# Altium footprint library TelemetryFTP.PcbLib: 98 footprints (part 6 of 7)
Each footprint in its own frame and in the unit in brackets; x right, y up, seen from the top. Pads: shape width x height; smd on the part's side, far side on the other; paste and mask are expansions set on the pad; w line width, h text height; cw(c..) or ccw(c..) is an arc to the next point about the centre after c.
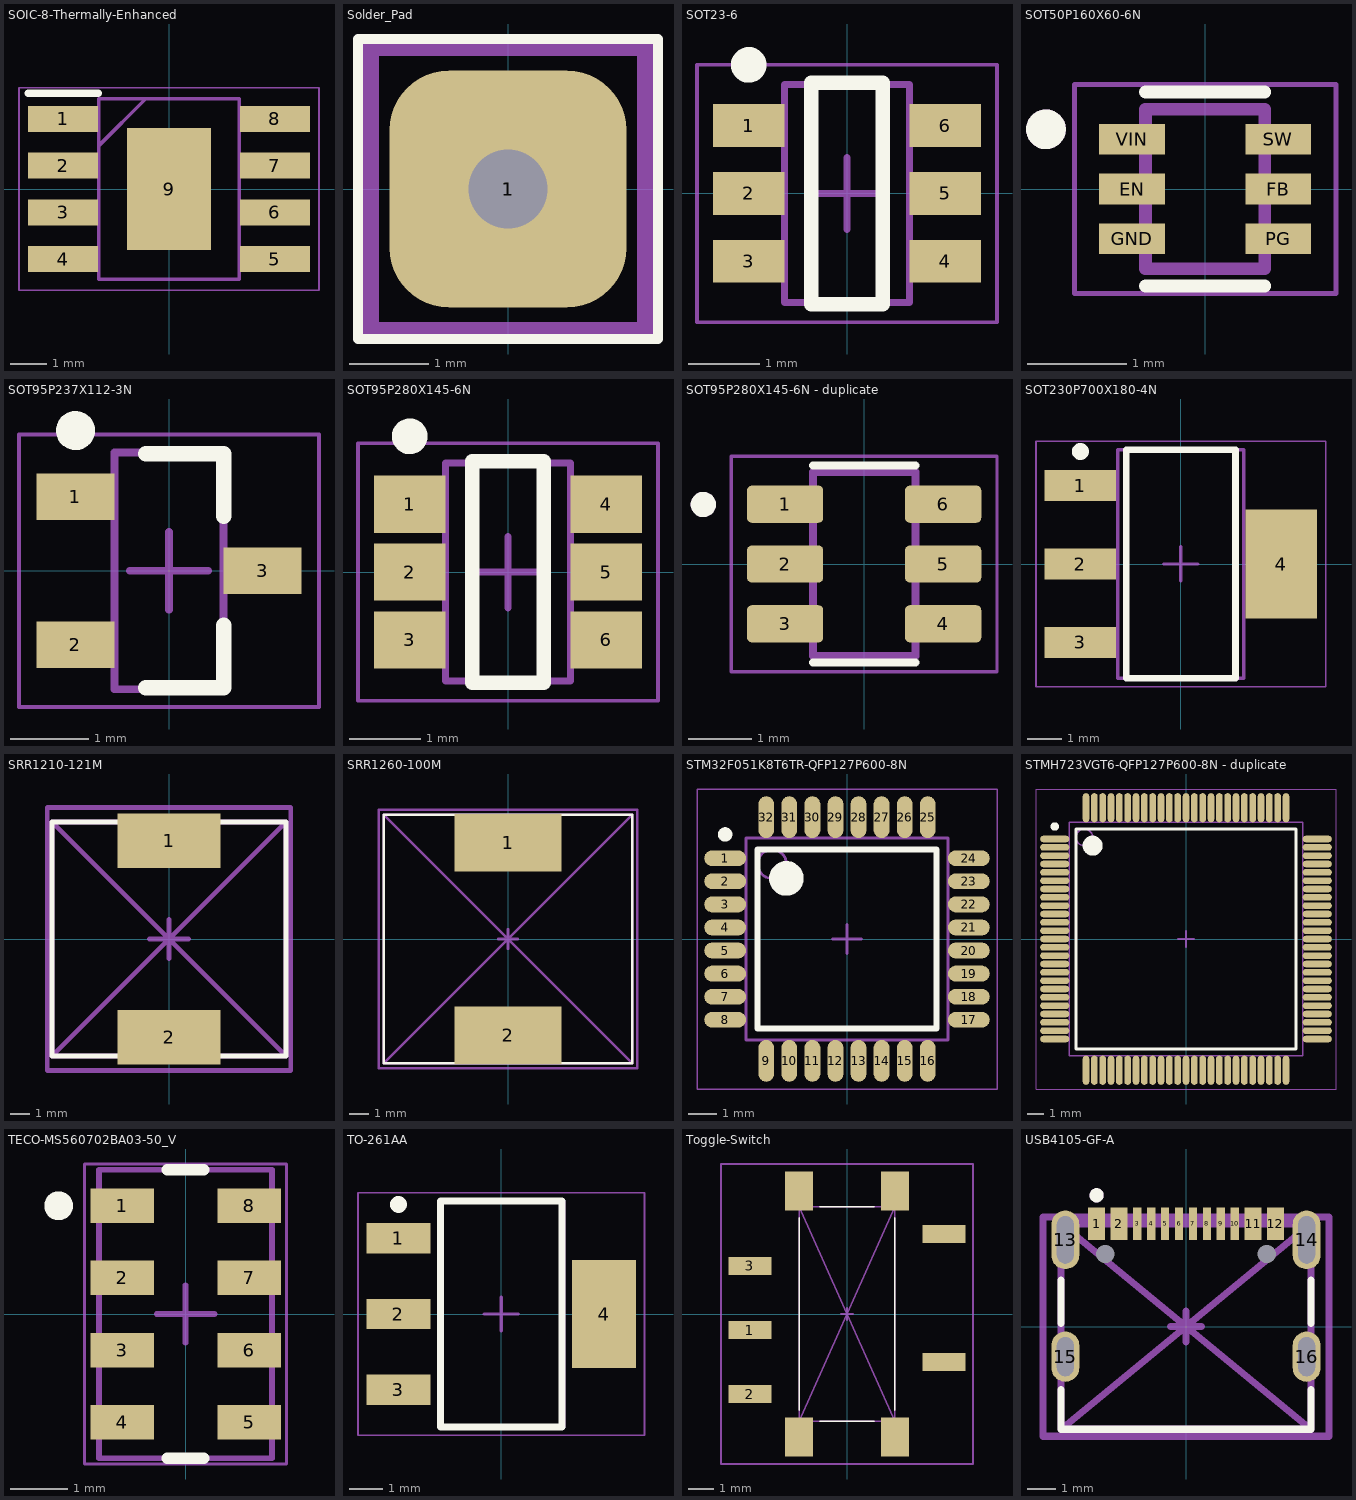
[diagram p5: the footprints below, top view; thin cyan lines are the x and y axes]

## SOIC-8-Thermally-Enhanced [mm] "Standard SOIC-8 symbol with thermal pad"
pads (9):
  rect 1.9x0.7 smd: 1(-2.875,1.905) 2(-2.875,0.635) 3(-2.875,-0.635) 4(-2.875,-1.905) 5(2.875,-1.905) 6(2.875,-0.635) 7(2.875,0.635) 8(2.875,1.905)
  rect 2.287x3.307 smd: 9(0,0)
Top Overlay:
  lines w0.2: -3.825,2.605 -1.925,2.605
Mechanical 13:
  lines w0.1: -1.905,1.181 -0.635,2.451 ; -1.905,-2.451 -1.905,2.451 1.905,2.451 1.905,-2.451 -1.905,-2.451
Mechanical 15:
  lines w0.05: -4.075,-2.752 -4.075,2.752 4.075,2.752 4.075,-2.752 -4.075,-2.752
3D body "NR111E.stp": height 1.5, standoff 0, extent -3.203,-2.451 3.203,2.451

## Solder_Pad [mm]
pads (2):
  round 1.1 hole 1 mask+0.05: 1(0,0)
  rrect50% 3x3 hole 0.5 mask+0.05: 1(0,0)
Top Overlay:
  lines w0.128: -1.9,-1.9 -1.9,1.9 1.9,1.9 1.9,-1.9 -1.9,-1.9
Top Courtyard:
  lines w0.128: -1.8,-1.8 -1.8,1.8 1.8,1.8 1.8,-1.8 -1.8,-1.8
Mechanical 13:
  lines w0.128: -1.7,-1.75 -1.7,1.75 1.7,1.75 1.7,-1.75 -1.7,-1.75
Top Component Center:
  lines w0.128: -0.5,0 0.475,0 ; 0,-0.5 0,0.5

## SOT23-6 [mm] "SOT23, 6-Leads, Body 2.90x2.80mm, Pitch 0.95mm, IPC Medium Density"
height 1.45
pads (6):
  rect 1x0.6 smd: 1(-1.375,0.95) 2(-1.375,0) 3(-1.375,-0.95) 4(1.375,-0.95) 5(1.375,0) 6(1.375,0.95)
Top Overlay:
  circle w0.25: c-1.375,1.8 r0.125
  lines w0.2: -0.5,-1.55 -0.5,1.55 0.5,1.55 0.5,-1.55 -0.5,-1.55
Top Courtyard:
  lines w0.05: -2.1,-1.8 2.1,-1.8 2.1,1.8 -2.1,1.8 -2.1,-1.8
  lines w0.1: -0.5,0 0.5,0 ; 0,-0.5 0,0.5
Top Assembly:
  lines w0.1: -0.875,-1.525 0.875,-1.525 0.875,1.525 -0.875,1.525 -0.875,-1.525
3D body: height 1.45, standoff 0, extent -0.875,-1.525 0.875,1.525

## SOT50P160X60-6N [mm]
pads (6):
  rect 0.66x0.31 smd mask+0.05: EN(-0.735,0) FB(0.735,0) GND(-0.735,-0.5) PG(0.735,-0.5) SW(0.735,0.5) VIN(-0.735,0.5)
Top Overlay:
  circle w0.2: c-1.6,0.6 r0.1
  lines w0.127: -0.6,-0.975 0.6,-0.975 ; -0.6,0.975 0.6,0.975
Mechanical 13:
  circle w0.2: c-1.6,0.6 r0.1
  lines w0.127: -0.6,-0.8 -0.6,0.8 0.6,0.8 0.6,-0.8 -0.6,-0.8
Mechanical 15:
  lines w0.05: -1.315,-1.05 -1.315,1.05 1.315,1.05 1.315,-1.05 -1.315,-1.05

## SOT95P237X112-3N [mm] "SOT23, 3-Leads, Body 2.92x2.37mm, Pitch 0.95mm, IPC Medium Density"
height 1.12
pads (3):
  rect 1x0.6 smd: 1(-1.2,0.95) 2(-1.2,-0.95) 3(1.2,0)
Top Overlay:
  circle w0.25: c-1.2,1.8 r0.125
  lines w0.2: -0.3,-1.5 0.7,-1.5 0.7,-0.7 ; -0.3,1.5 0.7,1.5 0.7,0.7
Top Courtyard:
  lines w0.05: -1.925,-1.75 -1.925,1.75 1.925,1.75 1.925,-1.75 -1.925,-1.75
  lines w0.1: -0.5,0 0.5,0 ; 0,-0.5 0,0.5
Top Assembly:
  lines w0.1: -0.7,-1.52 -0.7,1.52 0.7,1.52 0.7,-1.52 -0.7,-1.52
3D body: height 1.12, standoff 0.1, extent -0.7,-1.52 0.7,1.52

## SOT95P280X145-6N [mm] "SOT23, 6-Leads, Body 2.90x2.80mm, Pitch 0.95mm, IPC Medium Density"
height 1.45
pads (6):
  rect 1x0.8 smd mask+0.05: 1(-1.375,0.95) 2(-1.375,0) 3(-1.375,-0.95) 4(1.375,0.95) 5(1.375,0) 6(1.375,-0.95)
Top Overlay:
  circle w0.25: c-1.375,1.9 r0.125
  lines w0.2: -0.5,-1.55 0.5,-1.55 0.5,1.55 -0.5,1.55 -0.5,-1.55
Top Courtyard:
  lines w0.05: -2.1,-1.8 -2.1,1.8 2.1,1.8 2.1,-1.8 -2.1,-1.8
  lines w0.1: -0.5,0 0.5,0 ; 0,-0.5 0,0.5
Top Assembly:
  lines w0.1: -0.875,-1.525 -0.875,1.525 0.875,1.525 0.875,-1.525 -0.875,-1.525
3D body: height 1.45, standoff 0, extent -0.875,-1.525 0.875,1.525

## SOT95P280X145-6N - duplicate [mm]
pads (6):
  rrect25% 1.21x0.59 smd: 1(-1.255,0.95) 2(-1.255,0) 3(-1.255,-0.95) 4(1.255,-0.95) 5(1.255,0) 6(1.255,0.95)
Top Overlay:
  circle w0.2: c-2.555,0.945 r0.1
  lines w0.127: -0.813,-1.565 0.813,-1.565 ; -0.813,1.565 0.813,1.565
Mechanical 13:
  circle w0.2: c-2.555,0.945 r0.1
  lines w0.127: -0.813,-1.462 -0.813,1.462 0.813,1.462 0.813,-1.462 -0.813,-1.462
Mechanical 15:
  lines w0.05: -2.11,-1.713 2.11,-1.713 2.11,1.713 -2.11,1.713 -2.11,-1.713
3D body "step_temp.STEP": height 0.4, standoff -1.05, extent -1.4,-1.462 1.4,1.462

## SOT230P700X180-4N [mm] "SOT223, 4-Leads, Body 6.50x7.00mm (avg), Pitch 2.30mm, IPC Medium Density"
height 1.8
pads (4):
  rect 2.1x0.9 smd: 1(-2.95,2.3) 2(-2.95,0) 3(-2.95,-2.3)
  rect 2.1x3.2 smd: 4(2.95,0)
Top Overlay:
  circle w0.25: c-2.95,3.3 r0.125
  lines w0.2: -1.6,-3.35 1.6,-3.35 1.6,3.35 -1.6,3.35 -1.6,-3.35
Mechanical 13:
  lines w0.1: -1.85,-3.35 1.85,-3.35 1.85,3.35 -1.85,3.35 -1.85,-3.35
Mechanical 15:
  lines w0.05: -4.25,-3.6 4.25,-3.6 4.25,3.6 -4.25,3.6 -4.25,-3.6
  lines w0.1: -0.5,0 0.5,0 ; 0,-0.5 0,0.5
3D body: height 1.8, standoff 0.01, extent -1.85,-3.35 1.85,3.35

## SRR1210-121M [mm]
pads (2):
  rect 5.3x2.8 smd mask+0.05: 1(0,5.05) 2(0,-5.05)
Top Overlay:
  lines w0.256: -6,-6 6,-6 6,6 -6,6 -6,-6
Mechanical 1:
  lines w0.256: -6,-6 6,6 ; -6,-6 6,-6 ; -6,-6 -6,6 ; -6,6 6,-6 ; -6,6 6,6 ; 6,-6 6,6
Top Courtyard:
  lines w0.256: -6.25,-6.75 -6.25,6.75 6.25,6.75 6.25,-6.75 -6.25,-6.75
Top Component Center:
  lines w0.256: -1,0 1,0 ; 0,-1 0,1
3D body "IND_BOURNS_SRR1210.step": height 10.11, standoff 0.1, extent -6.251,-6.248 6.251,6.248

## SRR1260-100M [mm]
pads (2):
  rect 5.4x2.9 smd mask+0.05: 1(0,4.85) 2(0,-4.85)
Top Overlay:
  lines w0.127: -6.25,-6.25 6.25,-6.25 6.25,6.25 -6.25,6.25 -6.25,-6.25
Mechanical 1:
  lines w0.127: -6.25,-6.25 6.25,-6.25 ; -6.25,-6.25 -6.25,6.25 ; -6.25,-6.25 6.25,6.25 ; -6.25,6.25 6.25,6.25 ; -6.25,6.25 6.25,-6.25 ; 6.25,-6.25 6.25,6.25
Top Courtyard:
  lines w0.127: -6.5,-6.5 6.5,-6.5 6.5,6.5 -6.5,6.5 -6.5,-6.5
Top Designator:
  lines w0.127: -0.5,0 0.5,0 ; 0,-0.5 0,0.5
3D body "IND_BOURNS_SRR1260.step": height 6.8, standoff 0.3, extent -6.403,-6.401 6.403,6.401

## STM32F051K8T6TR-QFP127P600-8N [mm]
height 1.6
pads (32):
  oval 1.45x0.55 smd mask+0.05: 1(-4.225,2.8) 2(-4.225,2) 3(-4.225,1.2) 4(-4.225,0.4) 5(-4.225,-0.4) 6(-4.225,-1.2) 7(-4.225,-2) 8(-4.225,-2.8) 17(4.225,-2.8) 18(4.225,-2) 19(4.225,-1.2) 20(4.225,-0.4) 21(4.225,0.4) 22(4.225,1.2) 23(4.225,2) 24(4.225,2.8)
  oval 0.55x1.45 smd mask+0.05: 9(-2.8,-4.225) 10(-2,-4.225) 11(-1.2,-4.225) 12(-0.4,-4.225) 13(0.4,-4.225) 14(1.2,-4.225) 15(2,-4.225) 16(2.8,-4.225) 25(2.8,4.225) 26(2,4.225) 27(1.2,4.225) 28(0.4,4.225) 29(-0.4,4.225) 30(-1.2,4.225) 31(-2,4.225) 32(-2.8,4.225)
Top Overlay:
  circle w0.25: c-4.225,3.625 r0.125
  circle w0.6: c-2.1,2.1 r0.3
  lines w0.2: -3.1,-3.1 -3.1,3.1 3.1,3.1 3.1,-3.1 -3.1,-3.1
Top Courtyard:
  lines w0.05: -5.2,-5.2 -5.2,5.2 5.2,5.2 5.2,-5.2 -5.2,-5.2
  lines w0.1: -0.5,0 0.5,0 ; 0,-0.5 0,0.5
Top Assembly:
  circle w0.1: c-2.6,2.6 r0.5
  lines w0.1: -3.5,-3.5 -3.5,3.5 3.5,3.5 3.5,-3.5 -3.5,-3.5
3D body "LQFP-32.step": height 1.6, standoff 0, extent -4.496,-4.496 4.496,4.496

## STMH723VGT6-QFP127P600-8N - duplicate [mm]
height 1.6
pads (100):
  oval 1.75x0.4 smd mask+0.05: 1(-7.875,6) 2(-7.875,5.5) 3(-7.875,5) 4(-7.875,4.5) 5(-7.875,4) 6(-7.875,3.5) 7(-7.875,3) 8(-7.875,2.5) 9(-7.875,2) 10(-7.875,1.5) 11(-7.875,1) 12(-7.875,0.5) 13(-7.875,0) 14(-7.875,-0.5) 15(-7.875,-1) 16(-7.875,-1.5) 17(-7.875,-2) 18(-7.875,-2.5) 19(-7.875,-3) 20(-7.875,-3.5) 21(-7.875,-4) 22(-7.875,-4.5) 23(-7.875,-5) 24(-7.875,-5.5) 25(-7.875,-6) 51(7.875,-6) 52(7.875,-5.5) 53(7.875,-5) 54(7.875,-4.5) 55(7.875,-4) 56(7.875,-3.5) 57(7.875,-3) 58(7.875,-2.5) 59(7.875,-2) 60(7.875,-1.5) 61(7.875,-1) 62(7.875,-0.5) 63(7.875,0) 64(7.875,0.5) 65(7.875,1) 66(7.875,1.5) 67(7.875,2) 68(7.875,2.5) 69(7.875,3) 70(7.875,3.5) 71(7.875,4) 72(7.875,4.5) 73(7.875,5) 74(7.875,5.5) 75(7.875,6)
  oval 0.4x1.75 smd mask+0.05: 26(-6,-7.875) 27(-5.5,-7.875) 28(-5,-7.875) 29(-4.5,-7.875) 30(-4,-7.875) 31(-3.5,-7.875) 32(-3,-7.875) 33(-2.5,-7.875) 34(-2,-7.875) 35(-1.5,-7.875) 36(-1,-7.875) 37(-0.5,-7.875) 38(0,-7.875) 39(0.5,-7.875) 40(1,-7.875) 41(1.5,-7.875) 42(2,-7.875) 43(2.5,-7.875) 44(3,-7.875) 45(3.5,-7.875) 46(4,-7.875) 47(4.5,-7.875) 48(5,-7.875) 49(5.5,-7.875) 50(6,-7.875) 76(6,7.875) 77(5.5,7.875) 78(5,7.875) 79(4.5,7.875) 80(4,7.875) 81(3.5,7.875) 82(3,7.875) 83(2.5,7.875) 84(2,7.875) 85(1.5,7.875) 86(1,7.875) 87(0.5,7.875) 88(0,7.875) 89(-0.5,7.875) 90(-1,7.875) 91(-1.5,7.875) 92(-2,7.875) 93(-2.5,7.875) 94(-3,7.875) 95(-3.5,7.875) 96(-4,7.875) 97(-4.5,7.875) 98(-5,7.875) 99(-5.5,7.875) 100(-6,7.875)
Top Overlay:
  circle w0.6: c-5.6,5.6 r0.3
  circle w0.25: c-7.875,6.75 r0.125
  lines w0.2: -6.6,-6.6 6.6,-6.6 6.6,6.6 -6.6,6.6 -6.6,-6.6
Top Courtyard:
  lines w0.05: -9,-9 9,-9 9,9 -9,9 -9,-9
  lines w0.1: -0.5,0 0.5,0 ; 0,-0.5 0,0.5
Top Assembly:
  circle w0.1: c-6.1,6.1 r0.5
  lines w0.1: -7,-7 7,-7 7,7 -7,7 -7,-7
3D body "LQFP100_STM.step": height 1.6, standoff 0, extent -8.103,-8.103 8.103,8.103

## TECO-MS560702BA03-50_V [mm] "SMD, 8-Leads, Body 3x5mm, Pitch 1.25mm"
height 1
pads (8):
  rect 1.1x0.6 smd: 1(-1.1,1.875) 2(-1.1,0.625) 3(-1.1,-0.625) 4(-1.1,-1.875) 5(1.1,-1.875) 6(1.1,-0.625) 7(1.1,0.625) 8(1.1,1.875)
Top Overlay:
  circle w0.25: c-2.2,1.875 r0.125
  lines w0.2: -0.316,-2.5 0.316,-2.5 ; -0.316,2.5 0.316,2.5
Mechanical 13:
  lines w0.1: -1.5,-2.5 1.5,-2.5 1.5,2.5 -1.5,2.5 -1.5,-2.5
Mechanical 15:
  lines w0.05: -1.75,-2.6 1.75,-2.6 1.75,2.6 -1.75,2.6 -1.75,-2.6
  lines w0.1: -0.5,0 0.5,0 ; 0,-0.5 0,0.5
3D body: height 1, standoff 0, extent -1.5,-2.5 1.5,2.5

## TO-261AA [mm] "SOT223, 4-Leads, Body 6.50x7.00mm (avg), Pitch 2.25mm, IPC Medium Density"
height 1.8
pads (4):
  rect 1.9x0.9 smd: 1(-3.05,2.25) 2(-3.05,0) 3(-3.05,-2.25)
  rect 1.9x3.2 smd: 4(3.05,0)
Top Overlay:
  circle w0.25: c-3.05,3.25 r0.125
  lines w0.2: -1.8,-3.35 1.8,-3.35 1.8,3.35 -1.8,3.35 -1.8,-3.35
Top Courtyard:
  lines w0.05: -4.25,-3.6 4.25,-3.6 4.25,3.6 -4.25,3.6 -4.25,-3.6
  lines w0.1: -0.5,0 0.5,0 ; 0,-0.5 0,0.5
Top Assembly:
  lines w0.1: -1.85,-3.35 1.85,-3.35 1.85,3.35 -1.85,3.35 -1.85,-3.35
3D body "TO-261AA.step": height 1.8, standoff 0, extent -3.5,-3.35 3.5,3.35

## Toggle-Switch [mm]
pads (9):
  rect 1.7x0.7 smd mask+0.05: 1(-3.85,-0.635) 2(-3.85,-3.175) 3(-3.85,1.905) ""(3.85,-1.905) ""(3.85,3.175)
  rect 1.1x1.55 smd mask+0.05: ""(-1.9,-4.875) ""(-1.9,4.875) ""(1.9,-4.875) ""(1.9,4.875)
Top Overlay:
  lines w0.064: -1.9,-3.825 -1.9,3.825 ; -1.075,-4.25 1.075,-4.25 ; -1.075,4.25 1.075,4.25 ; 1.9,-3.825 1.9,3.825
Mechanical 1:
  lines w0.064: -1.9,-4.25 1.9,4.25 ; -1.9,-4.25 1.9,-4.25 ; -1.9,-4.25 -1.9,4.25 ; -1.9,4.25 1.9,-4.25 ; -1.9,4.25 1.9,4.25 ; 1.9,-4.25 1.9,4.25
Top Courtyard:
  lines w0.064: -5,-5.95 -2.525,-5.95 2.475,-5.95 5,-5.95 5,5.95 2.5,5.95 -2.45,5.95 -5,5.95 -5,-5.95
Top Component Center:
  lines w0.064: -0.25,0 0,0 ; 0,-0.25 0,0.25 ; 0,0 0.25,0 0,0
3D body "G3T12AB.stp": height 12.95, standoff 0.01, extent -3.797,-5.499 3.797,5.499

## USB4105-GF-A [mm]
pads (18):
  rect 0.6x1.15 smd mask+0.05: 1(-3.2,3.68) 2(-2.4,3.68) 11(2.4,3.68) 12(3.2,3.68)
  rect 0.3x1.15 smd mask+0.05: 3(-1.75,3.68) 4(-1.25,3.68) 5(-0.75,3.68) 6(-0.25,3.68) 7(0.25,3.68) 8(0.75,3.68) 9(1.25,3.68) 10(1.75,3.68)
  oval 1x2.1 hole 0.6 slot 1.7 at 90 deg: 13(-4.32,3.105) 14(4.32,3.105)
  oval 1x1.8 hole 0.6 slot 1.4 at 90 deg mask+0.05: 15(-4.32,-1.075) 16(4.32,-1.075)
  round 0 hole 0.65: ""(-2.89,2.605) ""(2.89,2.605)
Top Overlay:
  circle w0.254: c-3.2,4.7 r0.127
  lines w0.254: -4.47,-2.259 -4.47,-3.675 4.47,-3.675 4.47,-2.259 ; -4.47,0.11 -4.47,1.668 ; 4.47,0.11 4.47,1.668
Mechanical 1:
  circle w0.254: c-3.2,4.7 r0.127
  lines w0.254: -4.47,-3.675 4.47,3.675 ; -4.47,-3.675 -4.47,3.675 ; -4.47,-3.675 4.47,-3.675 ; -4.47,3.675 4.47,-3.675 ; -4.47,3.675 4.47,3.675 ; 4.47,-3.675 4.47,3.675
Top Courtyard:
  lines w0.254: -5.125,-3.925 -5.125,-3.683 -5.125,-2.159 -5.125,1.778 -5.125,3.683 -5.125,3.925 -4.72,3.925 -4.445,3.925 4.445,3.925 4.72,3.925 5.125,3.925 5.125,3.683 5.125,-2.159 5.125,-3.683 5.125,-3.925 4.72,-3.925 4.445,-3.925 -4.445,-3.925 -4.72,-3.925 -5.125,-3.925
Top Component Center:
  lines w0.254: -0.55,0 0.55,0 ; 0,-0.55 0,0 0,0.55
3D body "USB-Model.STEP": height 3.31, standoff -1.1, extent -4.47,-3.725 4.47,3.985